# Altium schematic symbol library LATTICEPLDS_Library.SchLib: 291 symbols (part 6 of 32) (continued)
## LCMXO3L-4300-MG121 (continued)
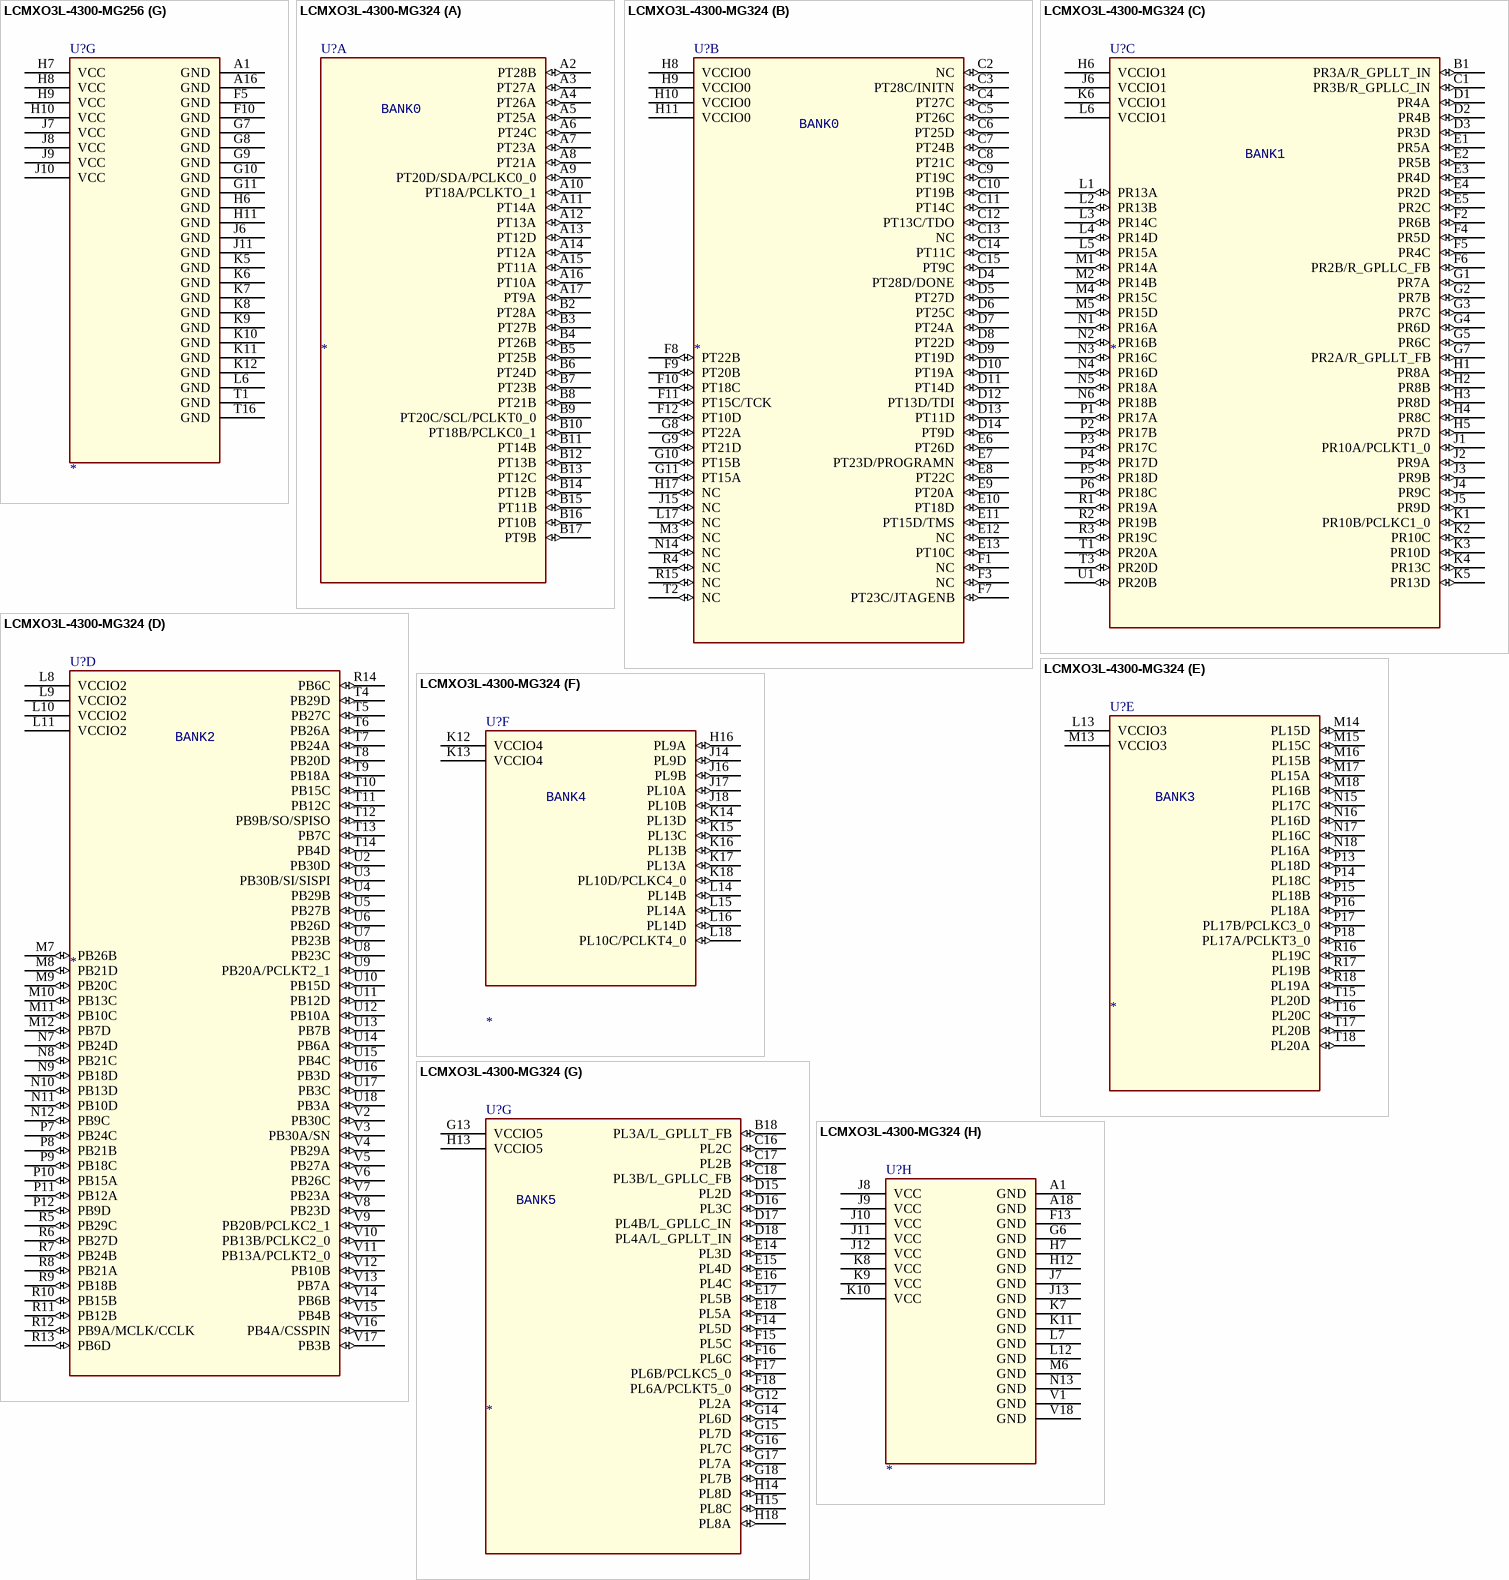
[diagram p58: symbols LCMXO3L-4300-MG256 to LCMXO3L-4300-MG324]
part A text: BANK0
part B text: BANK1
part C text: BANK2
part D text: BANK3,4,5

## LCMXO3L-4300-MG256
designator U?
SWAP_INFO: (S1+S2+S3+S4+S5+S6+S7); SPLIT_INST: TRUE
part A pins: A3 PT28A (io), A4 PT27A (io), A5 PT24C (io), A6 PT24A (io), A7 PT22B (io), A8 PT20C/SCL/PCLKT0_0 (io), A9 PT18B/PCLKC0_1 (io), A10 PT15B (io), A11 PT14C (io), A12 PT14B (io), A13 PT11A (io), A14 PT9A (io), A15 PT9C (io), B3 PT28B (io), B4 PT27B (io), B5 PT24D (io), B6 PT24B (io), B7 PT22A (io), B8 PT20D/SDA/PCLKC0_0 (io), B9 PT18A/PCLKT0_1 (io), B10 PT15A (io), B11 PT14D (io), B12 PT14A (io), B13 PT11B (io), B14 PT9B (io), C4 PT28C/INITN (io), C5 PT25B (io), C6 PT23D/PROGRAMN (io), C7 PT23C/JTAGENB (io), C8 PT20B (io), C9 PT20A (io), C10 PT15C/TCK (io), C11 PT15D/TMS (io), C12 PT13D/TDI (io), C13 PT12A (io), D5 PT28D/DONE (io), D6 PT25A (io), D7 PT23A (io), D8 PT21A (io), D9 PT19B (io), D10 PT13B (io), D11 PT13C/TDO (io), D12 PT12B (io), E5 PT26B (io), E6 PT26A (io), E7 PT23B (io), E8 PT21B (io), E9 PT19A (io), E10 PT13A (io), E11 PT10B (io), E12 PT10A (io), F6 VCCIO0 (power), F7 VCCIO0 (power), F8 VCCIO0 (power), F9 VCCIO0 (power)
part B pins: A2 PR2A/R_GPLLT_FB (io), B1 PR3A/R_GPLLT_IN (io), B2 PR2B/R_GPLLC_FB (io), C1 PR5B (io), C2 PR3B/R_GPLLC_IN (io), C3 PR4D (io), D1 PR6A (io), D2 PR5A (io), D3 PR4C (io), D4 PR2C (io), E1 PR8C (io), E2 PR6B (io), E3 PR6D (io), E4 PR2D (io), F1 PR9B (io), F2 PR8D (io), F3 PR6C (io), F4 PR5C (io), G1 PR10B/PCLKC1_0 (io), G2 PR9A (io), G3 PR8B (io), G4 PR8A (io), G5 PR5D (io), G6 VCCIO1 (power), H1 PR10C (io), H2 PR10A/PCLKT1_0 (io), H3 PR9D (io), H4 PR9C (io), H5 VCCIO1 (power), J1 PR13A (io), J2 PR10D (io), J3 PR13D (io), J4 PR13C (io), J5 VCCIO1 (power), K1 PR13B (io), K2 PR14A (io), K3 PR14D (io), K4 PR15C (io), L1 PR14B (io), L2 PR14C (io), L3 PR16C (io), L4 PR16D (io), L5 PR15D (io), M1 PR15A (io), M2 PR15B (io), M3 PR18A (io), M4 PR19B (io), N1 PR16A (io), N2 PR18B (io), N3 PR19A (io), N4 PR20D (io), P1 PR16B (io), P2 PR18D (io), P3 PR20C (io), R1 PR18C (io)
part C pins: L7 VCCIO2 (power), L8 VCCIO2 (power), L9 VCCIO2 (power), L10 VCCIO2 (power), M5 PB30A/SN (io), M6 PB27A (io), M7 PB24B (io), M8 PB21B (io), M9 PB15B (io), M10 PB10B (io), M11 PB7A (io), M12 PB3D (io), N5 PB30B/SI/SISPI (io), N6 PB27B (io), N7 PB24A (io), N8 PB21A (io), N9 PB15A (io), N10 PB10A (io), N11 PB7B (io), N12 PB3C (io), P4 PB30D (io), P5 PB30C (io), P6 PB23D (io), P7 PB23C (io), P8 PB15D (io), P9 PB15C (io), P10 PB10C (io), P11 PB9D (io), P12 PB6A (io), P13 PB3A (io), R2 PB29A (io), R3 PB26A (io), R4 PB24D (io), R5 PB23B (io), R6 PB21D (io), R7 PB20B/PCLKC2_1 (io), R8 PB18A (io), R9 PB13B/PCLKC2_0 (io), R10 PB10D (io), R11 PB9B/SO/SPISO (io), R12 PB9C (io), R13 PB6B (io), R14 PB3B (io), T2 PB29B (io), T3 PB26B (io), T4 PB24C (io), T5 PB23A (io), T6 PB21C (io), T7 PB20A/PCLKT2_1 (io), T8 PB18B (io), T9 PB13A/PCLKT2_0 (io), T10 PB12B (io), T11 PB12A (io), T12 PB9A/MCLK/CCLK (io), T13 PB4A/CSSPIN (io), T14 PB4B (io)
part D pins: K13 PL16C (io), L11 VCCIO3 (power), L12 VCCIO3 (power), L13 PL17D (io), L14 PL16D (io), M13 PL20A (io), M14 PL17C (io), M15 PL16B (io), N13 PL20B (io), N14 PL20C (io), N15 PL17B/PCLKC3_0 (io), N16 PL16A (io), P14 PL20D (io), P15 PL18C (io), P16 PL17A/PCLKT3_0 (io), R15 PL19A (io), R16 PL18D (io), T15 PL19B (io)
part E pins: G15 PL9A (io), G16 PL9B (io), H12 VCCIO4 (power), H13 PL9C (io), H14 PL9D (io), H15 PL10A (io), H16 PL10B (io), J12 VCCIO4 (power), J13 PL13C (io), J14 PL13D (io), J15 PL10D/PCLKC4_0 (io), J16 PL10C/PCLKT4_0 (io), K14 PL14D (io), K15 PL13B (io), K16 PL13A (io), L15 PL14B (io), L16 PL14C (io), M16 PL14A (io)
part F pins: B15 PL3A/L_GPLLT_FB (io), B16 PL3B/L_GPLLC_FB (io), C14 PL2D (io), C15 PL4A/L_GPLLT_IN (io), C16 PL4B/L_GPLLC_IN (io), D13 PL2C (io), D14 PL4C (io), D15 PL6A/PCLKT5_0 (io), D16 PL6B/PCLKC5_0 (io), E13 PL4D (io), E14 PL7D (io), E15 PL7C (io), E16 PL8C (io), F11 VCCIO5 (power), F12 PL6D (io), F13 PL6C (io), F14 PL8A (io), F15 PL8B (io), F16 PL8D (io), G12 VCCIO5 (power), G13 PL7A (io), G14 PL7B (io)
part G pins: A1 GND (power), A16 GND (power), F5 GND (power), F10 GND (power), G7 GND (power), G8 GND (power), G9 GND (power), G10 GND (power), G11 GND (power), H6 GND (power), H7 VCC (power), H8 VCC (power), H9 VCC (power), H10 VCC (power), H11 GND (power), J6 GND (power), J7 VCC (power), J8 VCC (power), J9 VCC (power), J10 VCC (power), J11 GND (power), K5 GND (power), K6 GND (power), K7 GND (power), K8 GND (power), K9 GND (power), K10 GND (power), K11 GND (power), K12 GND (power), L6 GND (power), T1 GND (power), T16 GND (power)
part A text: BANK0
part B text: BANK1
part C text: BANK2
part D text: BANK3
part E text: BANK4
part F text: BANK5

## LCMXO3L-4300-MG324
designator U?
SWAP_INFO: (S1+S2+S3+S4+S5+S6+S7+S8); SPLIT_INST: TRUE
part A pins: A2 PT28B (io), A3 PT27A (io), A4 PT26A (io), A5 PT25A (io), A6 PT24C (io), A7 PT23A (io), A8 PT21A (io), A9 PT20D/SDA/PCLKC0_0 (io), A10 PT18A/PCLKTO_1 (io), A11 PT14A (io), A12 PT13A (io), A13 PT12D (io), A14 PT12A (io), A15 PT11A (io), A16 PT10A (io), A17 PT9A (io), B2 PT28A (io), B3 PT27B (io), B4 PT26B (io), B5 PT25B (io), B6 PT24D (io), B7 PT23B (io), B8 PT21B (io), B9 PT20C/SCL/PCLKT0_0 (io), B10 PT18B/PCLKC0_1 (io), B11 PT14B (io), B12 PT13B (io), B13 PT12C (io), B14 PT12B (io), B15 PT11B (io), B16 PT10B (io), B17 PT9B (io)
part B pins: C2 NC (io), C3 PT28C/INITN (io), C4 PT27C (io), C5 PT26C (io), C6 PT25D (io), C7 PT24B (io), C8 PT21C (io), C9 PT19C (io), C10 PT19B (io), C11 PT14C (io), C12 PT13C/TDO (io), C13 NC (io), C14 PT11C (io), C15 PT9C (io), D4 PT28D/DONE (io), D5 PT27D (io), D6 PT25C (io), D7 PT24A (io), D8 PT22D (io), D9 PT19D (io), D10 PT19A (io), D11 PT14D (io), D12 PT13D/TDI (io), D13 PT11D (io), D14 PT9D (io), E6 PT26D (io), E7 PT23D/PROGRAMN (io), E8 PT22C (io), E9 PT20A (io), E10 PT18D (io), E11 PT15D/TMS (io), E12 NC (io), E13 PT10C (io), F1 NC (io), F3 NC (io), F7 PT23C/JTAGENB (io), F8 PT22B (io), F9 PT20B (io), F10 PT18C (io), F11 PT15C/TCK (io), F12 PT10D (io), G8 PT22A (io), G9 PT21D (io), G10 PT15B (io), G11 PT15A (io), H8 VCCIO0 (power), H9 VCCIO0 (power), H10 VCCIO0 (power), H11 VCCIO0 (power), H17 NC (io), J15 NC (io), L17 NC (io), M3 NC (io), N14 NC (io), R4 NC (io), R15 NC (io), T2 NC (io)
part C pins: B1 PR3A/R_GPLLT_IN (io), C1 PR3B/R_GPLLC_IN (io), D1 PR4A (io), D2 PR4B (io), D3 PR3D (io), E1 PR5A (io), E2 PR5B (io), E3 PR4D (io), E4 PR2D (io), E5 PR2C (io), F2 PR6B (io), F4 PR5D (io), F5 PR4C (io), F6 PR2B/R_GPLLC_FB (io), G1 PR7A (io), G2 PR7B (io), G3 PR7C (io), G4 PR6D (io), G5 PR6C (io), G7 PR2A/R_GPLLT_FB (io), H1 PR8A (io), H2 PR8B (io), H3 PR8D (io), H4 PR8C (io), H5 PR7D (io), H6 VCCIO1 (power), J1 PR10A/PCLKT1_0 (io), J2 PR9A (io), J3 PR9B (io), J4 PR9C (io), J5 PR9D (io), J6 VCCIO1 (power), K1 PR10B/PCLKC1_0 (io), K2 PR10C (io), K3 PR10D (io), K4 PR13C (io), K5 PR13D (io), K6 VCCIO1 (power), L1 PR13A (io), L2 PR13B (io), L3 PR14C (io), L4 PR14D (io), L5 PR15A (io), L6 VCCIO1 (power), M1 PR14A (io), M2 PR14B (io), M4 PR15C (io), M5 PR15D (io), N1 PR16A (io), N2 PR16B (io), N3 PR16C (io), N4 PR16D (io), N5 PR18A (io), N6 PR18B (io), P1 PR17A (io), P2 PR17B (io), P3 PR17C (io), P4 PR17D (io), P5 PR18D (io), P6 PR18C (io), R1 PR19A (io), R2 PR19B (io), R3 PR19C (io), T1 PR20A (io), T3 PR20D (io), U1 PR20B (io)
part D pins: L8 VCCIO2 (power), L9 VCCIO2 (power), L10 VCCIO2 (power), L11 VCCIO2 (power), M7 PB26B (io), M8 PB21D (io), M9 PB20C (io), M10 PB13C (io), M11 PB10C (io), M12 PB7D (io), N7 PB24D (io), N8 PB21C (io), N9 PB18D (io), N10 PB13D (io), N11 PB10D (io), N12 PB9C (io), P7 PB24C (io), P8 PB21B (io), P9 PB18C (io), P10 PB15A (io), P11 PB12A (io), P12 PB9D (io), R5 PB29C (io), R6 PB27D (io), R7 PB24B (io), R8 PB21A (io), R9 PB18B (io), R10 PB15B (io), R11 PB12B (io), R12 PB9A/MCLK/CCLK (io), R13 PB6D (io), R14 PB6C (io), T4 PB29D (io), T5 PB27C (io), T6 PB26A (io), T7 PB24A (io), T8 PB20D (io), T9 PB18A (io), T10 PB15C (io), T11 PB12C (io), T12 PB9B/SO/SPISO (io), T13 PB7C (io), T14 PB4D (io), U2 PB30D (io), U3 PB30B/SI/SISPI (io), U4 PB29B (io), U5 PB27B (io), U6 PB26D (io), U7 PB23B (io), U8 PB23C (io), U9 PB20A/PCLKT2_1 (io), U10 PB15D (io), U11 PB12D (io), U12 PB10A (io), U13 PB7B (io), U14 PB6A (io), U15 PB4C (io), U16 PB3D (io), U17 PB3C (io), U18 PB3A (io), V2 PB30C (io), V3 PB30A/SN (io), V4 PB29A (io), V5 PB27A (io), V6 PB26C (io), V7 PB23A (io), V8 PB23D (io), V9 PB20B/PCLKC2_1 (io), V10 PB13B/PCLKC2_0 (io), V11 PB13A/PCLKT2_0 (io), V12 PB10B (io), V13 PB7A (io), V14 PB6B (io), V15 PB4B (io), V16 PB4A/CSSPIN (io), V17 PB3B (io)
part E pins: L13 VCCIO3 (power), M13 VCCIO3 (power), M14 PL15D (io), M15 PL15C (io), M16 PL15B (io), M17 PL15A (io), M18 PL16B (io), N15 PL17C (io), N16 PL16D (io), N17 PL16C (io), N18 PL16A (io), P13 PL18D (io), P14 PL18C (io), P15 PL18B (io), P16 PL18A (io), P17 PL17B/PCLKC3_0 (io), P18 PL17A/PCLKT3_0 (io), R16 PL19C (io), R17 PL19B (io), R18 PL19A (io), T15 PL20D (io), T16 PL20C (io), T17 PL20B (io), T18 PL20A (io)
part F pins: H16 PL9A (io), J14 PL9D (io), J16 PL9B (io), J17 PL10A (io), J18 PL10B (io), K12 VCCIO4 (power), K13 VCCIO4 (power), K14 PL13D (io), K15 PL13C (io), K16 PL13B (io), K17 PL13A (io), K18 PL10D/PCLKC4_0 (io), L14 PL14B (io), L15 PL14A (io), L16 PL14D (io), L18 PL10C/PCLKT4_0 (io)
part G pins: B18 PL3A/L_GPLLT_FB (io), C16 PL2C (io), C17 PL2B (io), C18 PL3B/L_GPLLC_FB (io), D15 PL2D (io), D16 PL3C (io), D17 PL4B/L_GPLLC_IN (io), D18 PL4A/L_GPLLT_IN (io), E14 PL3D (io), E15 PL4D (io), E16 PL4C (io), E17 PL5B (io), E18 PL5A (io), F14 PL5D (io), F15 PL5C (io), F16 PL6C (io), F17 PL6B/PCLKC5_0 (io), F18 PL6A/PCLKT5_0 (io), G12 PL2A (io), G13 VCCIO5 (power), G14 PL6D (io), G15 PL7D (io), G16 PL7C (io), G17 PL7A (io), G18 PL7B (io), H13 VCCIO5 (power), H14 PL8D (io), H15 PL8C (io), H18 PL8A (io)
part H pins: A1 GND (power), A18 GND (power), F13 GND (power), G6 GND (power), H7 GND (power), H12 GND (power), J7 GND (power), J8 VCC (power), J9 VCC (power), J10 VCC (power), J11 VCC (power), J12 VCC (power), J13 GND (power), K7 GND (power), K8 VCC (power), K9 VCC (power), K10 VCC (power), K11 GND (power), L7 GND (power), L12 GND (power), M6 GND (power), N13 GND (power), V1 GND (power), V18 GND (power)
part A text: BANK0
part B text: BANK0
part C text: BANK1
part D text: BANK2
part E text: BANK3
part F text: BANK4
part G text: BANK5

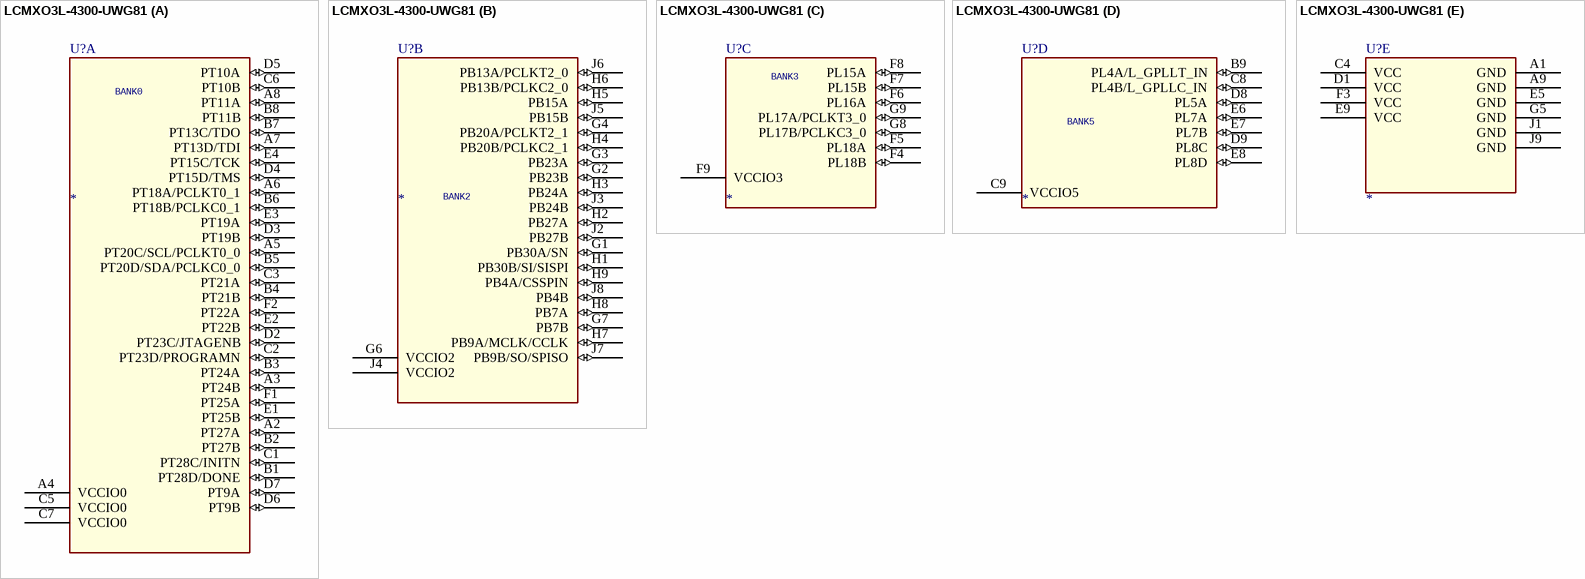
[diagram p59: symbol LCMXO3L-4300-UWG81]

## LCMXO3L-4300-UWG81
designator U?
SWAP_INFO: (S1+S2+S3+S4+S5); SPLIT_INST: TRUE
part A pins: A2 PT27A (io), A3 PT24B (io), A4 VCCIO0 (power), A5 PT20C/SCL/PCLKT0_0 (io), A6 PT18A/PCLKT0_1 (io), A7 PT13D/TDI (io), A8 PT11A (io), B1 PT28D/DONE (io), B2 PT27B (io), B3 PT24A (io), B4 PT21B (io), B5 PT20D/SDA/PCLKC0_0 (io), B6 PT18B/PCLKC0_1 (io), B7 PT13C/TDO (io), B8 PT11B (io), C1 PT28C/INITN (io), C2 PT23D/PROGRAMN (io), C3 PT21A (io), C5 VCCIO0 (power), C6 PT10B (io), C7 VCCIO0 (power), D2 PT23C/JTAGENB (io), D3 PT19B (io), D4 PT15D/TMS (io), D5 PT10A (io), D6 PT9B (io), D7 PT9A (io), E1 PT25B (io), E2 PT22B (io), E3 PT19A (io), E4 PT15C/TCK (io), F1 PT25A (io), F2 PT22A (io)
part B pins: G1 PB30A/SN (io), G2 PB23B (io), G3 PB23A (io), G4 PB20A/PCLKT2_1 (io), G6 VCCIO2 (power), G7 PB7B (io), H1 PB30B/SI/SISPI (io), H2 PB27A (io), H3 PB24A (io), H4 PB20B/PCLKC2_1 (io), H5 PB15A (io), H6 PB13B/PCLKC2_0 (io), H7 PB9A/MCLK/CCLK (io), H8 PB7A (io), H9 PB4A/CSSPIN (io), J2 PB27B (io), J3 PB24B (io), J4 VCCIO2 (power), J5 PB15B (io), J6 PB13A/PCLKT2_0 (io), J7 PB9B/SO/SPISO (io), J8 PB4B (io)
part C pins: F4 PL18B (io), F5 PL18A (io), F6 PL16A (io), F7 PL15B (io), F8 PL15A (io), F9 VCCIO3 (power), G8 PL17B/PCLKC3_0 (io), G9 PL17A/PCLKT3_0 (io)
part D pins: B9 PL4A/L_GPLLT_IN (io), C8 PL4B/L_GPLLC_IN (io), C9 VCCIO5 (power), D8 PL5A (io), D9 PL8C (io), E6 PL7A (io), E7 PL7B (io), E8 PL8D (io)
part E pins: A1 GND (power), A9 GND (power), C4 VCC (power), D1 VCC (power), E5 GND (power), E9 VCC (power), F3 VCC (power), G5 GND (power), J1 GND (power), J9 GND (power)
part A text: BANK0
part B text: BANK2
part C text: BANK3
part D text: BANK5

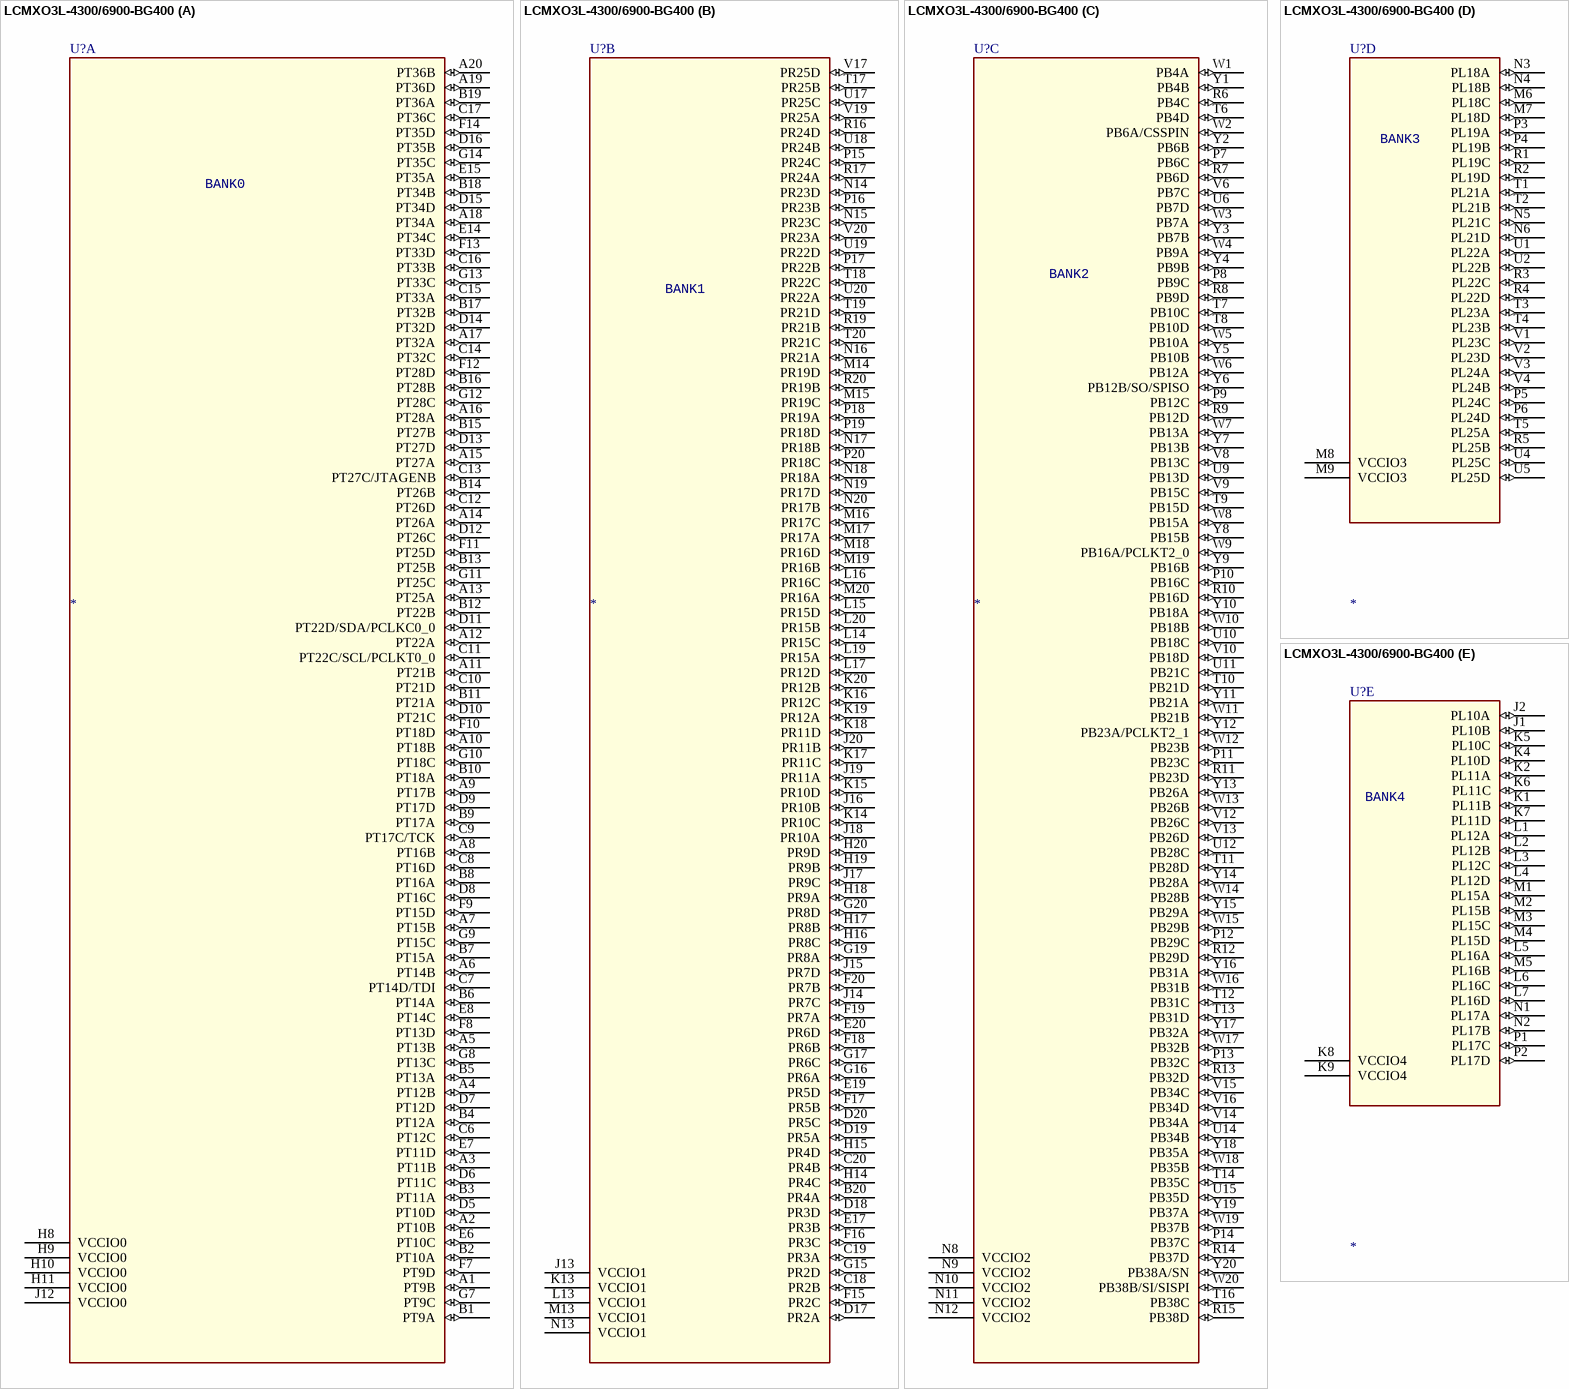
[diagram p60: symbol LCMXO3L-4300/6900-BG400]

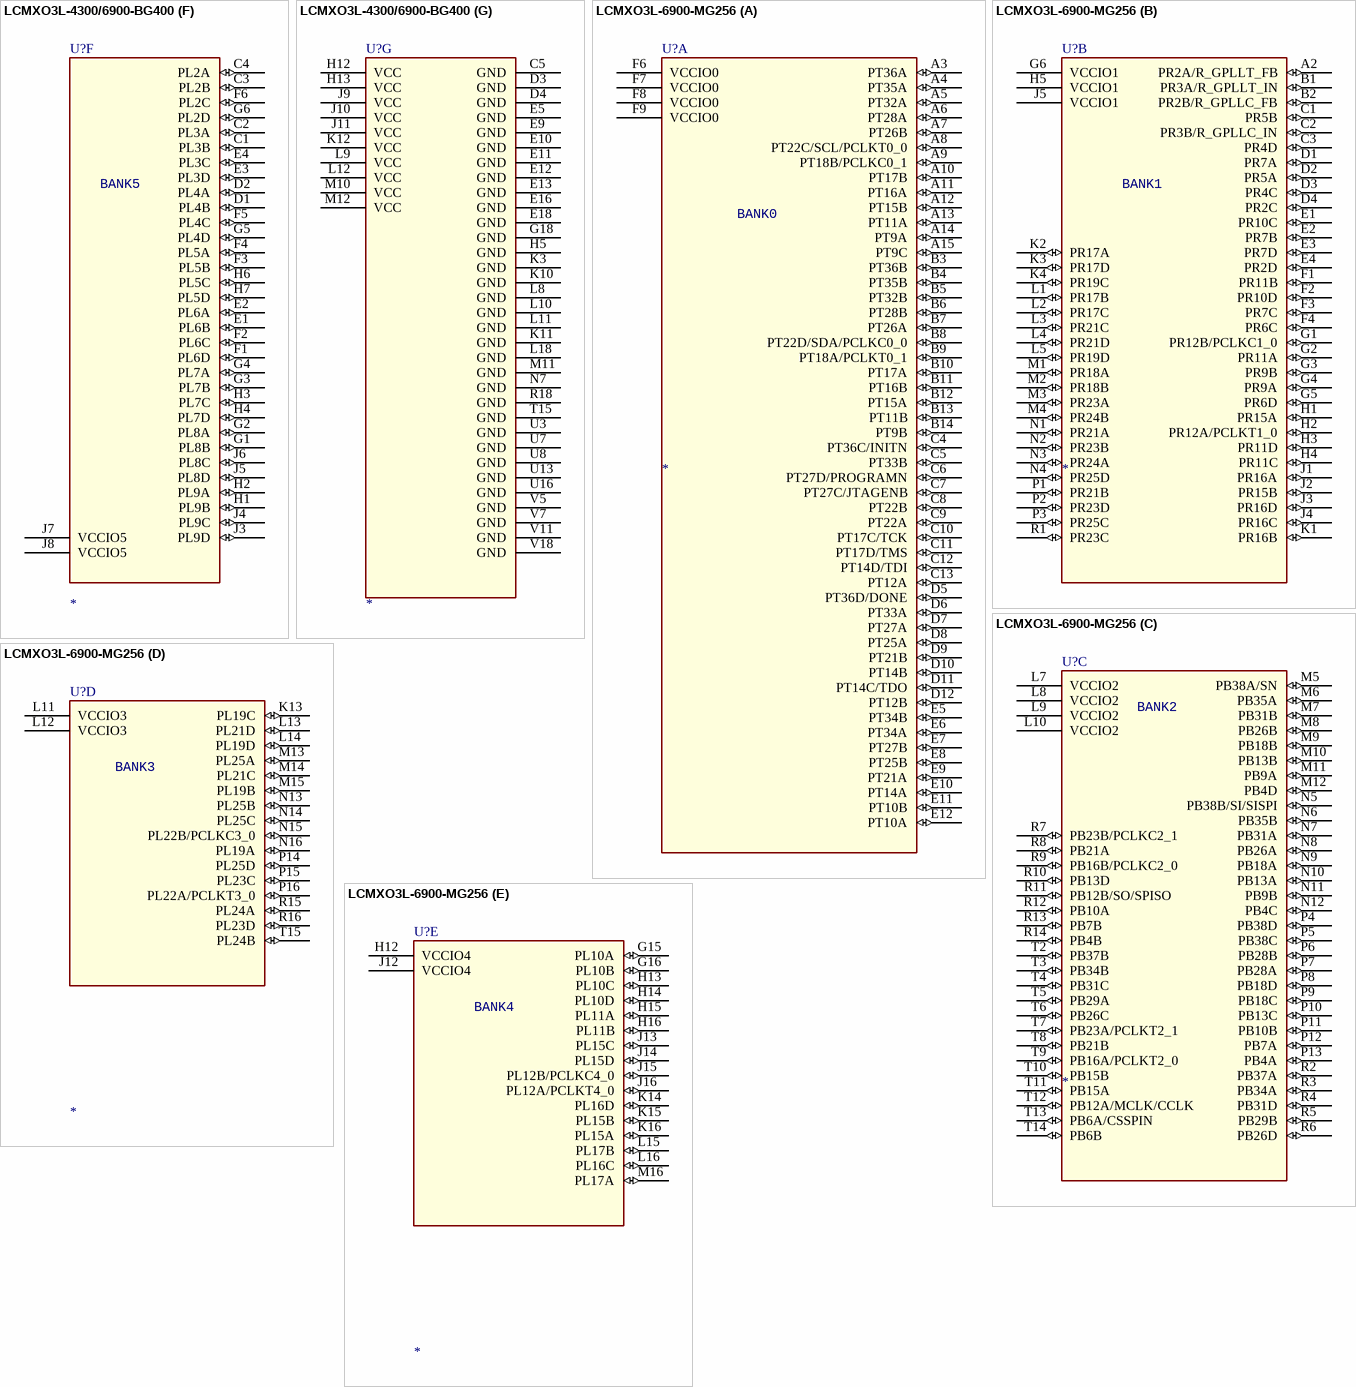
[diagram p61: symbols LCMXO3L-4300/6900-BG400 to LCMXO3L-6900-MG256]

## LCMXO3L-4300/6900-BG400
designator U?
SPLIT_INST: TRUE; SWAP_INFO: (S1+S2+S3+S4+S5+S6+S7)
part A pins: A1 PT9B (io), A2 PT10B (io), A3 PT11B (io), A4 PT12B (io), A5 PT13B (io), A6 PT14B (io), A7 PT15B (io), A8 PT16B (io), A9 PT17B (io), A10 PT18B (io), A11 PT21B (io), A12 PT22A (io), A13 PT25A (io), A14 PT26A (io), A15 PT27A (io), A16 PT28A (io), A17 PT32A (io), A18 PT34A (io), A19 PT36D (io), A20 PT36B (io), B1 PT9A (io), B2 PT10A (io), B3 PT11A (io), B4 PT12A (io), B5 PT13A (io), B6 PT14A (io), B7 PT15A (io), B8 PT16A (io), B9 PT17A (io), B10 PT18A (io), B11 PT21A (io), B12 PT22B (io), B13 PT25B (io), B14 PT26B (io), B15 PT27B (io), B16 PT28B (io), B17 PT32B (io), B18 PT34B (io), B19 PT36A (io), C6 PT12C (io), C7 PT14D/TDI (io), C8 PT16D (io), C9 PT17C/TCK (io), C10 PT21D (io), C11 PT22C/SCL/PCLKT0_0 (io), C12 PT26D (io), C13 PT27C/JTAGENB (io), C14 PT32C (io), C15 PT33A (io), C16 PT33B (io), C17 PT36C (io), D5 PT10D (io), D6 PT11C (io), D7 PT12D (io), D8 PT16C (io), D9 PT17D (io), D10 PT21C (io), D11 PT22D/SDA/PCLKC0_0 (io), D12 PT26C (io), D13 PT27D (io), D14 PT32D (io), D15 PT34D (io), D16 PT35B (io), E6 PT10C (io), E7 PT11D (io), E8 PT14C (io), E14 PT34C (io), E15 PT35A (io), F7 PT9D (io), F8 PT13D (io), F9 PT15D (io), F10 PT18D (io), F11 PT25D (io), F12 PT28D (io), F13 PT33D (io), F14 PT35D (io), G7 PT9C (io), G8 PT13C (io), G9 PT15C (io), G10 PT18C (io), G11 PT25C (io), G12 PT28C (io), G13 PT33C (io), G14 PT35C (io), H8 VCCIO0 (power), H9 VCCIO0 (power), H10 VCCIO0 (power), H11 VCCIO0 (power), J12 VCCIO0 (power)
part B pins: B20 PR4A (io), C18 PR2B (io), C19 PR3A (io), C20 PR4B (io), D17 PR2A (io), D18 PR3D (io), D19 PR5A (io), D20 PR5C (io), E17 PR3B (io), E19 PR5D (io), E20 PR6D (io), F15 PR2C (io), F16 PR3C (io), F17 PR5B (io), F18 PR6B (io), F19 PR7A (io), F20 PR7B (io), G15 PR2D (io), G16 PR6A (io), G17 PR6C (io), G19 PR8A (io), G20 PR8D (io), H14 PR4C (io), H15 PR4D (io), H16 PR8C (io), H17 PR8B (io), H18 PR9A (io), H19 PR9B (io), H20 PR9D (io), J13 VCCIO1 (power), J14 PR7C (io), J15 PR7D (io), J16 PR10B (io), J17 PR9C (io), J18 PR10A (io), J19 PR11A (io), J20 PR11B (io), K13 VCCIO1 (power), K14 PR10C (io), K15 PR10D (io), K16 PR12C (io), K17 PR11C (io), K18 PR11D (io), K19 PR12A (io), K20 PR12B (io), L13 VCCIO1 (power), L14 PR15C (io), L15 PR15D (io), L16 PR16C (io), L17 PR12D (io), L19 PR15A (io), L20 PR15B (io), M13 VCCIO1 (power), M14 PR19D (io), M15 PR19C (io), M16 PR17C (io), M17 PR17A (io), M18 PR16D (io), M19 PR16B (io), M20 PR16A (io), N13 VCCIO1 (power), N14 PR23D (io), N15 PR23C (io), N16 PR21A (io), N17 PR18B (io), N18 PR18A (io), N19 PR17D (io), N20 PR17B (io), P15 PR24C (io), P16 PR23B (io), P17 PR22B (io), P18 PR19A (io), P19 PR18D (io), P20 PR18C (io), R16 PR24D (io), R17 PR24A (io), R19 PR21B (io), R20 PR19B (io), T17 PR25B (io), T18 PR22C (io), T19 PR21D (io), T20 PR21C (io), U17 PR25C (io), U18 PR24B (io), U19 PR22D (io), U20 PR22A (io), V17 PR25D (io), V19 PR25A (io), V20 PR23A (io)
part C pins: N8 VCCIO2 (power), N9 VCCIO2 (power), N10 VCCIO2 (power), N11 VCCIO2 (power), N12 VCCIO2 (power), P7 PB6C (io), P8 PB9C (io), P9 PB12C (io), P10 PB16C (io), P11 PB23C (io), P12 PB29C (io), P13 PB32C (io), P14 PB37C (io), R6 PB4C (io), R7 PB6D (io), R8 PB9D (io), R9 PB12D (io), R10 PB16D (io), R11 PB23D (io), R12 PB29D (io), R13 PB32D (io), R14 PB37D (io), R15 PB38D (io), T6 PB4D (io), T7 PB10C (io), T8 PB10D (io), T9 PB15D (io), T10 PB21D (io), T11 PB28D (io), T12 PB31C (io), T13 PB31D (io), T14 PB35C (io), T16 PB38C (io), U6 PB7D (io), U9 PB13D (io), U10 PB18C (io), U11 PB21C (io), U12 PB28C (io), U14 PB34B (io), U15 PB35D (io), V6 PB7C (io), V8 PB13C (io), V9 PB15C (io), V10 PB18D (io), V12 PB26C (io), V13 PB26D (io), V14 PB34A (io), V15 PB34C (io), V16 PB34D (io), W1 PB4A (io), W2 PB6A/CSSPIN (io), W3 PB7A (io), W4 PB9A (io), W5 PB10A (io), W6 PB12A (io), W7 PB13A (io), W8 PB15A (io), W9 PB16A/PCLKT2_0 (io), W10 PB18B (io), W11 PB21B (io), W12 PB23B (io), W13 PB26B (io), W14 PB28B (io), W15 PB29B (io), W16 PB31B (io), W17 PB32B (io), W18 PB35B (io), W19 PB37B (io), W20 PB38B/SI/SISPI (io), Y1 PB4B (io), Y2 PB6B (io), Y3 PB7B (io), Y4 PB9B (io), Y5 PB10B (io), Y6 PB12B/SO/SPISO (io), Y7 PB13B (io), Y8 PB15B (io), Y9 PB16B (io), Y10 PB18A (io), Y11 PB21A (io), Y12 PB23A/PCLKT2_1 (io), Y13 PB26A (io), Y14 PB28A (io), Y15 PB29A (io), Y16 PB31A (io), Y17 PB32A (io), Y18 PB35A (io), Y19 PB37A (io), Y20 PB38A/SN (io)